# Altium footprint library SWLIB(150721).PcbLib: 348 footprints (part 16 of 22)
Each footprint in its own frame and in the unit in brackets; x right, y up, seen from the top. Pads: shape width x height; smd on the part's side, far side on the other; paste and mask are expansions set on the pad; w line width, h text height; cw(c..) or ccw(c..) is an arc to the next point about the centre after c.
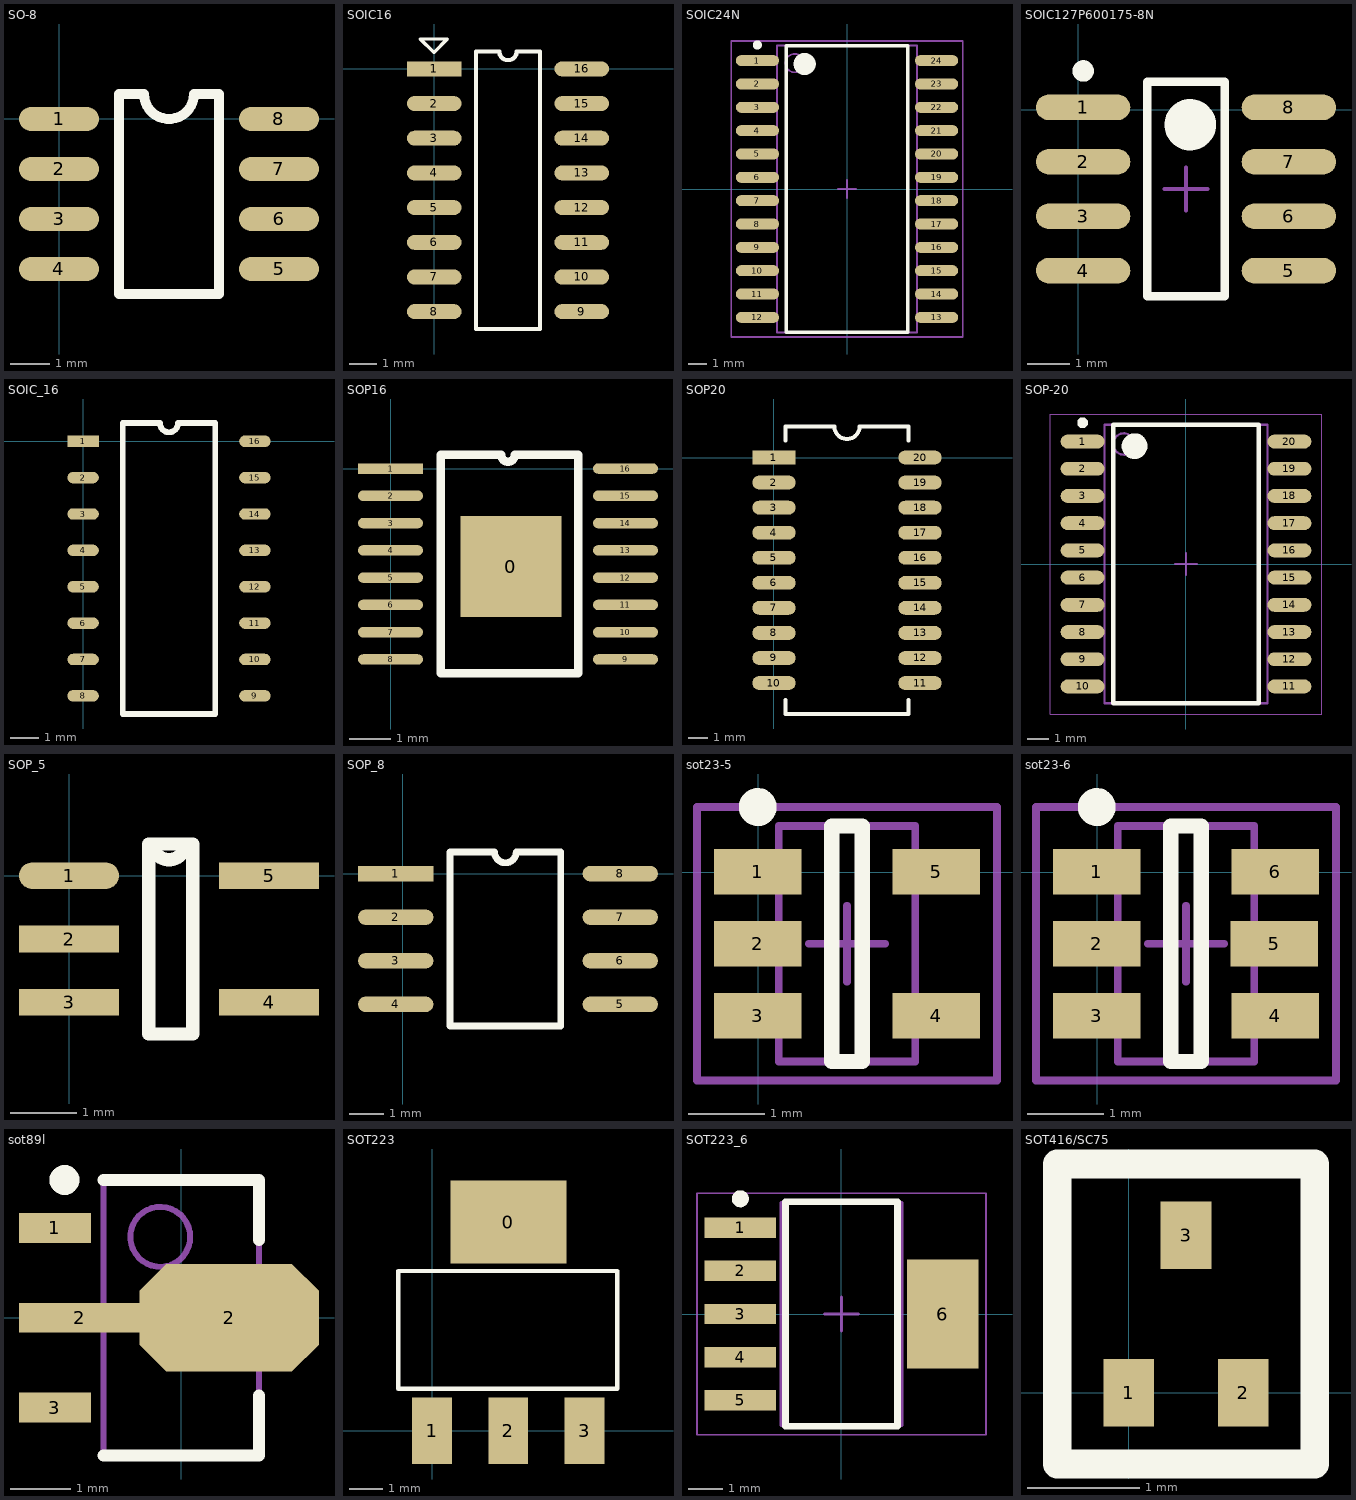
[diagram p15: the footprints below, top view; thin cyan lines are the x and y axes]

## SO-8 [mil]
pads (8):
  oval 80x24 smd: 1(0,0) 2(0,-50) 3(0,-100) 4(0,-150) 5(220,-150) 6(220,-100) 7(220,-50) 8(220,0)
Top Overlay:
  lines w10: 60,-175 60,25 85,25 ccw(c110,25) 135,25 160,25 160,-175 60,-175

## SOIC16 [mm]
pads (16):
  rect 2x0.55 smd: 1(0,0)
  oval 2x0.55 smd: 2(0,-1.27) 3(0,-2.54) 4(0,-3.81) 5(0,-5.08) 6(0,-6.35) 7(0,-7.62) 8(0,-8.89) 9(5.4,-8.89) 10(5.4,-7.62) 11(5.4,-6.35) 12(5.4,-5.08) 13(5.4,-3.81) 14(5.4,-2.54) 15(5.4,-1.27) 16(5.4,0)
Top Overlay:
  lines w0.127: -0.508,1.092 0.483,1.092 0,0.61 -0.025,0.61 -0.508,1.092
  lines w0.15: 1.535,-9.525 1.535,0.635 2.382,0.635 ccw(c2.7,0.635) 3.017,0.635 3.865,0.635 3.865,-9.525 1.535,-9.525
3D body: height 2, standoff 0.2, extent 0.991,-9.525 4.445,0.635

## SOIC24N [mm] "SOIC, 24-Leads, Body 15.6x7.6mm (max), Pitch 1.27mm, IPC Medium Density"
height 2.65
pads (24):
  oval 2.35x0.6 smd: 1(-4.875,6.985) 2(-4.875,5.715) 3(-4.875,4.445) 4(-4.875,3.175) 5(-4.875,1.905) 6(-4.875,0.635) 7(-4.875,-0.635) 8(-4.875,-1.905) 9(-4.875,-3.175) 10(-4.875,-4.445) 11(-4.875,-5.715) 12(-4.875,-6.985) 13(4.875,-6.985) 14(4.875,-5.715) 15(4.875,-4.445) 16(4.875,-3.175) 17(4.875,-1.905) 18(4.875,-0.635) 19(4.875,0.635) 20(4.875,1.905) 21(4.875,3.175) 22(4.875,4.445) 23(4.875,5.715) 24(4.875,6.985)
Top Overlay:
  circle w0.25: c-4.875,7.835 r0.125
  circle w0.6: c-2.3,6.8 r0.3
  lines w0.2: -3.3,-7.8 -3.3,7.8 3.3,7.8 3.3,-7.8 -3.3,-7.8
Mechanical 13:
  circle w0.1: c-2.85,6.85 r0.5
  lines w0.1: -3.8,-7.8 -3.8,7.8 3.8,7.8 3.8,-7.8 -3.8,-7.8
Mechanical 15:
  lines w0.1: -0.5,0 0.5,0 ; 0,-0.5 0,0.5 ; -6.3,-8.05 -6.3,8.05 6.3,8.05 6.3,-8.05 -6.3,-8.05
3D body: height 2.65, standoff 0.1, extent -3.8,-7.8 3.8,7.8

## SOIC127P600175-8N [mm]
pads (8):
  oval 2.2x0.6 smd: 1(0.115,0.051) 2(0.115,-1.219) 3(0.115,-2.489) 4(0.115,-3.759) 5(4.915,-3.759) 6(4.915,-2.489) 7(4.915,-1.219) 8(4.915,0.051)
Top Overlay:
  circle w0.25: c0.115,0.901 r0.125
  circle w0.6: c2.615,-0.354 r0.3
  lines w0.2: 1.615,-4.354 1.615,0.646 3.415,0.646 3.415,-4.354 1.615,-4.354
Mechanical 15:
  lines w0.1: 2.015,-1.854 3.015,-1.854 ; 2.515,-2.354 2.515,-1.354

## SOIC_16 [mm]
pads (16):
  rect 1.1x0.4 smd: 1(0,0)
  oval 1.1x0.4 smd: 2(0,-1.27) 3(0,-2.54) 4(0,-3.81) 5(0,-5.08) 6(0,-6.35) 7(0,-7.62) 8(0,-8.89) 9(6,-8.89) 10(6,-7.62) 11(6,-6.35) 12(6,-5.08) 13(6,-3.81) 14(6,-2.54) 15(6,-1.27) 16(6,0)
Top Overlay:
  lines w0.2: 1.385,-9.525 4.615,-9.525 4.615,0.635 3.317,0.635 cw(c3,0.635) 2.682,0.635 1.385,0.635 1.385,-9.525

## SOP16 [mm]
pads (17):
  rect 2.4x2.4 smd: 0(2.87,-2.337)
  rect 1.55x0.25 smd: 1(0,0)
  oval 1.55x0.25 smd: 2(0,-0.65) 3(0,-1.3) 4(0,-1.95) 5(0,-2.6) 6(0,-3.25) 7(0,-3.9) 8(0,-4.55) 9(5.6,-4.55) 10(5.6,-3.9) 11(5.6,-3.25) 12(5.6,-2.6) 13(5.6,-1.95) 14(5.6,-1.3) 15(5.6,-0.65) 16(5.6,0)
Top Overlay:
  lines w0.2: 1.194,-4.875 1.194,0.325 2.638,0.325 ccw(c2.8,0.325) 2.962,0.325 4.47,0.325 4.47,-4.875 1.194,-4.875

## SOP20 [mm] "窄的"
pads (20):
  rect 2.2x0.7 smd: 1(0,0)
  oval 2.2x0.7 smd: 2(0,-1.27) 3(0,-2.54) 4(0,-3.81) 5(0,-5.08) 6(0,-6.35) 7(0,-7.62) 8(0,-8.89) 9(0,-10.16) 10(0,-11.43) 11(7.4,-11.43) 12(7.4,-10.16) 13(7.4,-8.89) 14(7.4,-7.62) 15(7.4,-6.35) 16(7.4,-5.08) 17(7.4,-3.81) 18(7.4,-2.54) 19(7.4,-1.27) 20(7.4,0)
Top Overlay:
  lines w0.2: 0.59,-12.28 0.59,-13 6.81,-13 6.81,-12.28 ; 0.59,0.85 0.59,1.57 3.065,1.57 ccw(c3.7,1.57) 4.335,1.57 6.81,1.57 6.81,0.85

## SOP-20 [mm] "宽的"
height 2.5
pads (20):
  oval 2.05x0.65 smd: 1(-4.825,5.715) 2(-4.825,4.445) 3(-4.825,3.175) 4(-4.825,1.905) 5(-4.825,0.635) 6(-4.825,-0.635) 7(-4.825,-1.905) 8(-4.825,-3.175) 9(-4.825,-4.445) 10(-4.825,-5.715) 11(4.825,-5.715) 12(4.825,-4.445) 13(4.825,-3.175) 14(4.825,-1.905) 15(4.825,-0.635) 16(4.825,0.635) 17(4.825,1.905) 18(4.825,3.175) 19(4.825,4.445) 20(4.825,5.715)
Top Overlay:
  circle w0.6: c-2.4,5.5 r0.3
  circle w0.25: c-4.825,6.59 r0.125
  lines w0.2: -3.4,-6.5 3.4,-6.5 3.4,6.5 -3.4,6.5 -3.4,-6.5
Mechanical 13:
  circle w0.1: c-2.9,5.6 r0.5
  lines w0.1: -3.8,-6.5 3.8,-6.5 3.8,6.5 -3.8,6.5 -3.8,-6.5
Mechanical 15:
  lines w0.05: -6.325,-7 6.325,-7 6.325,7 -6.325,7 -6.325,-7
  lines w0.1: -0.5,0 0.5,0 ; 0,-0.5 0,0.5
3D body: height 2.5, standoff 0.1, extent -3.8,-6.5 3.8,6.5

## SOP_5 [mm]
pads (5):
  oval 1.5x0.4 smd: 1(0,0)
  rect 1.5x0.4 smd: 2(0,-0.95) 3(0,-1.9) 4(3,-1.9) 5(3,0)
Top Overlay:
  lines w0.2: 1.194,-2.375 1.854,-2.375 1.854,0.475 1.585,0.475 1.262,0.475 ccw(c1.5,0.475) 1.737,0.475 1.415,0.475 1.194,0.475 1.194,-2.375
3D body "SOT-23-5.STEP": height 1.2, standoff 0, extent 0.061,-2.365 2.961,0.435

## SOP_8 [mm]
pads (8):
  rect 2.2x0.45 smd: 1(-0.2,0)
  oval 2.2x0.45 smd: 2(-0.2,-1.27) 3(-0.2,-2.54) 4(-0.2,-3.81) 5(6.35,-3.81) 6(6.35,-2.54) 7(6.35,-1.27) 8(6.35,0)
Top Overlay:
  lines w0.2: 1.385,-4.445 1.385,0.635 2.682,0.635 ccw(c3,0.635) 3.317,0.635 4.615,0.635 4.615,-4.445 1.385,-4.445
3D body "SO-8.STEP": height 1.7, standoff 0, extent -0.003,-4.381 5.997,0.519

## sot23-5 [mm]
height 1.9
pads (5):
  rect 1.15x0.6 smd: 1(-0.007,0.01) 2(-0.007,-0.94) 3(-0.007,-1.89) 4(2.343,-1.89) 5(2.343,0.01)
Top Overlay:
  circle w0.25: c-0.007,0.86 r0.125
  lines w0.2: 0.968,-2.49 0.968,0.61 1.368,0.61 1.368,-2.49 0.968,-2.49
Mechanical 13:
  lines w0.1: 0.268,-2.49 2.068,-2.49 2.068,0.61 0.268,0.61 0.268,-2.49
Mechanical 15:
  lines w0.1: 0.668,-0.94 1.668,-0.94 ; 1.168,-1.44 1.168,-0.44 ; -0.807,-2.74 3.143,-2.74 3.143,0.86 -0.807,0.86 -0.807,-2.74
3D body "SOT-23-5.STEP": height 1.2, standoff 0, extent -0.231,-2.39 2.568,0.51

## sot23-6 [mm]
height 1.9
pads (6):
  rect 1.15x0.6 smd: 1(-0.007,0.01) 2(-0.007,-0.94) 3(-0.007,-1.89) 4(2.343,-1.89) 5(2.33,-0.94) 6(2.343,0.01)
Top Overlay:
  circle w0.25: c-0.007,0.86 r0.125
  lines w0.2: 0.968,-2.49 0.968,0.61 1.368,0.61 1.368,-2.49 0.968,-2.49
Mechanical 13:
  lines w0.1: 0.268,-2.49 2.068,-2.49 2.068,0.61 0.268,0.61 0.268,-2.49
Mechanical 15:
  lines w0.1: 0.668,-0.94 1.668,-0.94 ; 1.168,-1.44 1.168,-0.44 ; -0.807,-2.74 3.143,-2.74 3.143,0.86 -0.807,0.86 -0.807,-2.74
3D body "SOT-23-5.STEP": height 1.2, standoff 0, extent -0.231,-2.39 2.568,0.51

## sot89l [mm] "SOT89, 3-Leads, Body 4.5x2.4 mm, Pitch 1.5mm, Lead Span 4.1mm, IPC"
height 1.61
pads (4):
  rect 1.2x0.5 smd: 1(-2.108,1.499) 3(-2.108,-1.5)
  rect 2.032x0.5 smd: 2(-1.692,0)
  oct 3x1.8 smd: 2(0.8,0)
Top Overlay:
  circle w0.25: c-1.95,2.3 r0.125
  lines w0.2: -1.3,-2.3 1.3,-2.3 1.3,-1.3 ; -1.3,2.3 1.3,2.3 1.3,1.3
Mechanical 13:
  circle w0.1: c-0.35,1.35 r0.5
  lines w0.1: -1.3,-2.3 1.3,-2.3 1.3,2.3 -1.3,2.3 -1.3,-2.3
Mechanical 15:
  lines w0.1: -0.5,0 0.5,0 ; 0,-0.5 0,0.5
3D body "SOT-89.STEP": height 1.51, standoff 0, extent -2.438,-2.225 1.862,2.275

## SOT223 [mm]
pads (4):
  rect 3.5x2.5 smd: 0(2.3,6.3)
  rect 1.2x2 smd: 1(0,0) 2(2.3,0) 3(4.6,0)
Top Overlay:
  lines w0.127: -1.016,1.27 -1.016,4.826 5.588,4.826 5.588,1.27 -1.016,1.27

## SOT223_6 [mm] "SOT223, 6-Leads, Body 6.50x7.06mm (avg), Pitch 1.27mm, IPC Medium Density"
height 1.8
pads (6):
  rect 2.1x0.6 smd: 1(-2.975,2.54) 2(-2.975,1.27) 3(-2.975,0) 4(-2.975,-1.27) 5(-2.975,-2.54)
  rect 2.1x3.2 smd: 6(2.975,0)
Top Overlay:
  circle w0.25: c-2.975,3.39 r0.125
  lines w0.2: -1.65,-3.3 -1.65,3.3 1.65,3.3 1.65,-3.3 -1.65,-3.3
Mechanical 13:
  lines w0.1: -1.775,-3.275 -1.775,3.275 1.775,3.275 1.775,-3.275 -1.775,-3.275
Mechanical 15:
  lines w0.05: -4.25,-3.55 -4.25,3.55 4.25,3.55 4.25,-3.55 -4.25,-3.55
  lines w0.1: -0.5,0 0.5,0 ; 0,-0.5 0,0.5
3D body: height 1.8, standoff 0.02, extent -1.775,-3.275 1.775,3.275

## SOT416/SC75 [mm]
pads (3):
  rect 0.45x0.6 smd: 1(0,0) 2(1.016,0) 3(0.508,1.397)
Top Overlay:
  lines w0.254: -0.635,-0.635 -0.635,2.032 1.651,2.032 1.651,0.508 1.651,-0.635 -0.254,-0.635 -0.635,-0.635